# Altium footprint library THU VIEN V1.PcbLib: 400 footprints (part 6 of 25)
Each footprint in its own frame and in the unit in brackets; x right, y up, seen from the top. Pads: shape width x height; smd on the part's side, far side on the other; paste and mask are expansions set on the pad; w line width, h text height; cw(c..) or ccw(c..) is an arc to the next point about the centre after c.
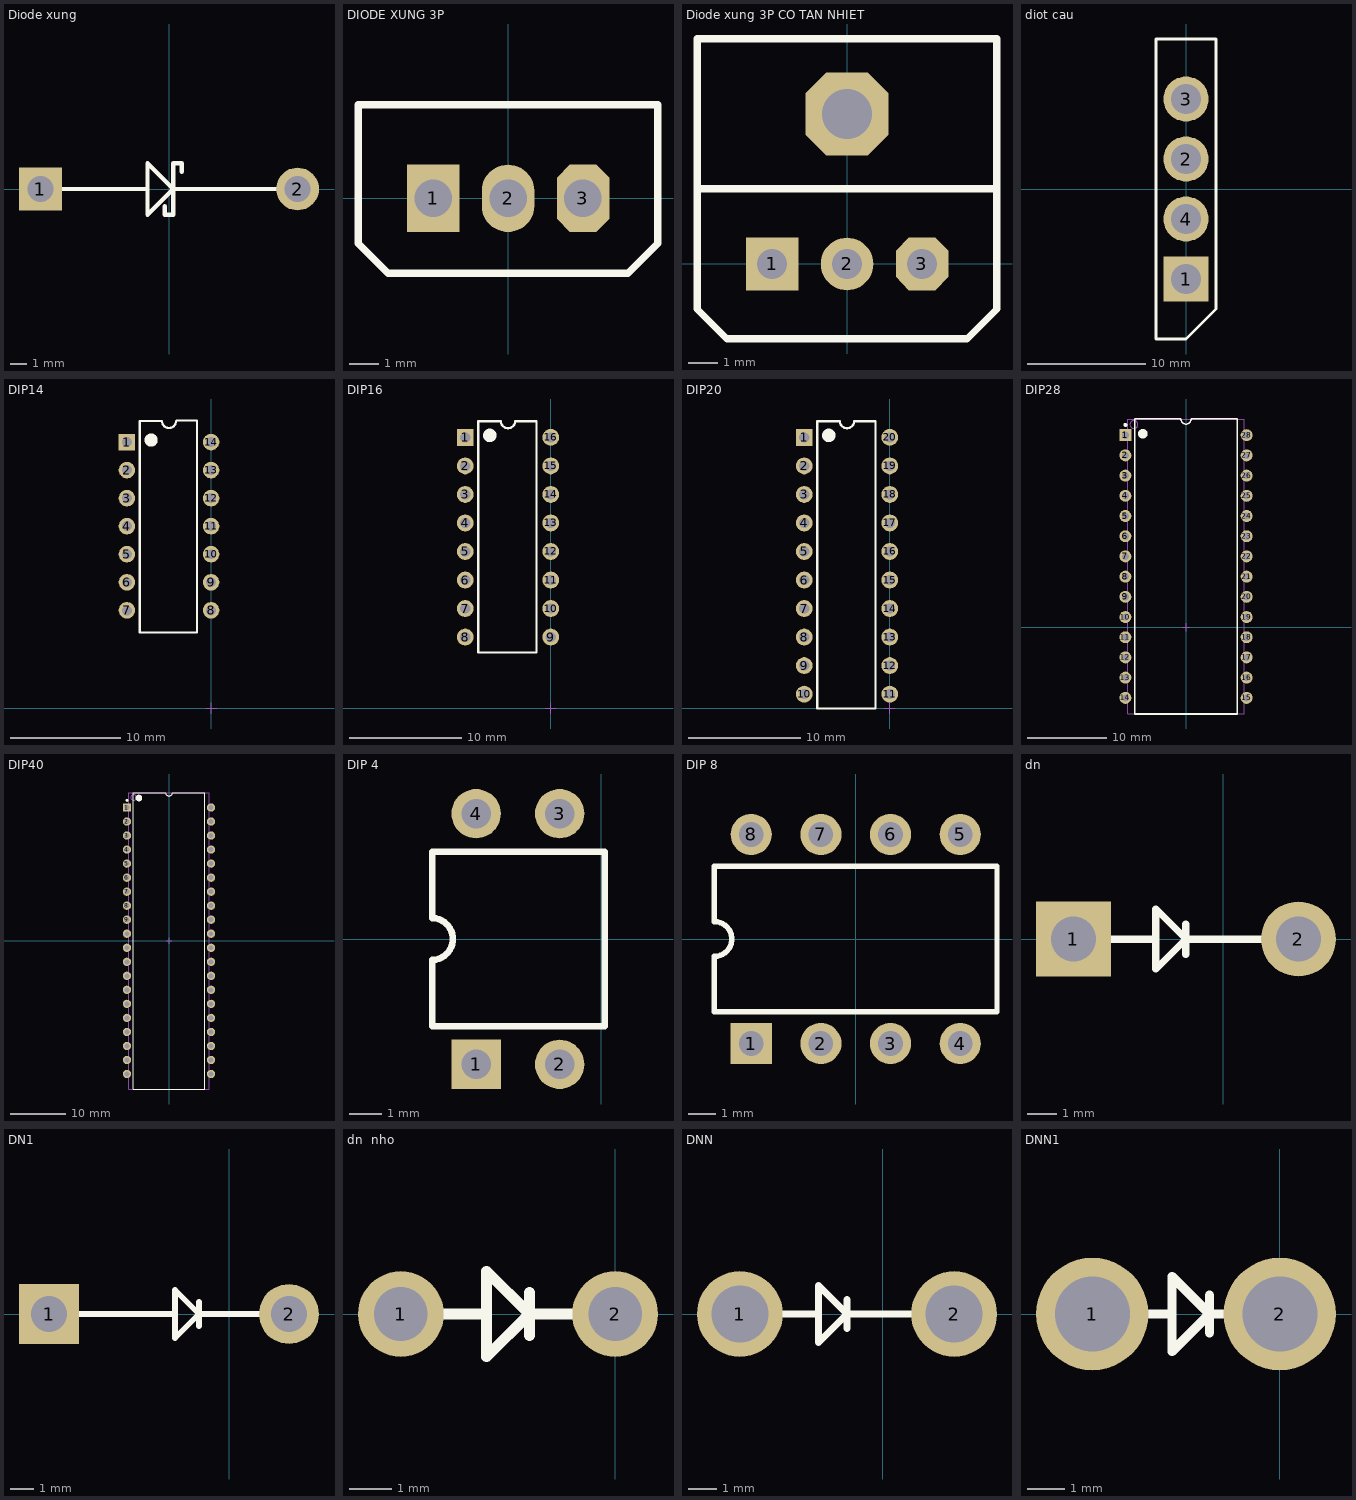
[diagram p5: the footprints below, top view; thin cyan lines are the x and y axes]

## Diode xung [mil]
pads (2):
  rect 100x100 hole 60: 1(-300,0)
  round 100 hole 60: 2(300,0)
Top Overlay:
  lines w10: -300,0 -50,0 ; -10,-40 -10,-60 10,-60 10,60 30,60 30,40 ; 300,0 10,0 ; 10,0 -50,60 -50,-60 10,0
3D body: height 188.58, standoff -96.85, extent -321.85,-88.59 321.85,88.58

## DIODE XUNG 3P [mil]
pads (3):
  rect 70x90 hole 50: 1(-100,0)
  oval 70x90 hole 50: 2(0,0)
  oct 70x90 hole 50: 3(100,0)
Top Overlay:
  lines w10: -200,-60 -200,125 200,125 200,-60 160,-100 -160,-100 -200,-60
3D body: height 854.72, standoff -300, extent -220.72,-58.85 220.73,125.8

## Diode xung 3P CO TAN NHIET [mil]
pads (4):
  rect 70x70 hole 40: 1(-100,0)
  round 70 hole 40: 2(0,0)
  oct 70x70 hole 40: 3(100,0)
  oct 110.24x110.24 hole 66.93: ""(0,200)
Top Overlay:
  lines w10: -200,100 200,100 ; -200,-60 -160,-100 160,-100 200,-60 200,300 -200,300 -200,-60
3D body: height 980, standoff -142.05, extent -245.03,44 251.03,299.94
3D body: height 854.72, standoff -300, extent -220.72,-58.85 220.73,125.8

## diot cau [mm]
pads (4):
  rect 3.81x3.81 hole 2.54: 1(0,-7.62)
  round 3.81 hole 2.54: 2(0,2.54) 3(0,7.62) 4(0,-2.54)
Top Overlay:
  lines w0.254: -2.54,-12.7 0,-12.7 2.54,-10.16 2.54,12.7 -2.54,12.7 -2.54,-12.7
3D body: height 22.61, standoff -14.02, extent -1.472,-11.15 2.288,11.15

## DIP14 [mm] "DIP, 40-Leads, Row Spacing 15.24mm, Pitch 2.54mm, Body 51.8x13.5mm"
height 6.35
pads (14):
  rect 1.5x1.5 hole 0.9: 1(-7.62,24.13)
  round 1.5 hole 0.9: 2(-7.62,21.59) 3(-7.62,19.05) 4(-7.62,16.51) 5(-7.62,13.97) 6(-7.62,11.43) 7(-7.62,8.89) 8(0,8.89) 9(0,11.43) 10(0,13.97) 11(0,16.51) 12(0,19.05) 13(0,21.59) 14(0,24.13)
Top Overlay:
  circle w0.6: c-5.431,24.308 r0.3
  lines w0.2: -3.175,26.035 cw(c-3.81,26.035) -4.445,26.035 -4.946,26.035 -6.45,26.035 -6.45,6.883 -1.27,6.883 -1.27,26.082 -1.372,26.082 -3.12,26.082 -3.124,26.086
Mechanical 15:
  lines w0.1: -0.5,0 0.5,0 ; 0,-0.5 0,0.5
3D body: height 5.1, standoff -3.3, extent -7.796,6.408 0.074,26.408

## DIP16 [mm] "DIP, 40-Leads, Row Spacing 15.24mm, Pitch 2.54mm, Body 51.8x13.5mm"
height 6.35
pads (16):
  rect 1.5x1.5 hole 0.9: 1(-7.62,24.13)
  round 1.5 hole 0.9: 2(-7.62,21.59) 3(-7.62,19.05) 4(-7.62,16.51) 5(-7.62,13.97) 6(-7.62,11.43) 7(-7.62,8.89) 8(-7.62,6.35) 9(0,6.35) 10(0,8.89) 11(0,11.43) 12(0,13.97) 13(0,16.51) 14(0,19.05) 15(0,21.59) 16(0,24.13)
Top Overlay:
  circle w0.6: c-5.431,24.308 r0.3
  lines w0.2: -6.45,4.978 -6.45,25.578 -4.445,25.578 ccw(c-3.81,25.578) -3.175,25.578 -1.27,25.578 -1.27,4.978 -6.45,4.978
Mechanical 15:
  lines w0.1: -0.5,0 0.5,0 ; 0,-0.5 0,0.5
3D body: height 5.1, standoff -3.3, extent -7.72,5.248 0.15,25.248

## DIP20 [mm] "DIP, 40-Leads, Row Spacing 15.24mm, Pitch 2.54mm, Body 51.8x13.5mm"
height 6.35
pads (20):
  rect 1.5x1.5 hole 0.9: 1(-7.62,24.13)
  round 1.5 hole 0.9: 2(-7.62,21.59) 3(-7.62,19.05) 4(-7.62,16.51) 5(-7.62,13.97) 6(-7.62,11.43) 7(-7.62,8.89) 8(-7.62,6.35) 9(-7.62,3.81) 10(-7.62,1.27) 11(0,1.27) 12(0,3.81) 13(0,6.35) 14(0,8.89) 15(0,11.43) 16(0,13.97) 17(0,16.51) 18(0,19.05) 19(0,21.59) 20(0,24.13)
Top Overlay:
  circle w0.6: c-5.431,24.308 r0.3
  lines w0.2: -6.45,0 -6.45,25.578 -4.445,25.578 ccw(c-3.81,25.578) -3.175,25.578 -1.27,25.578 -1.27,0 -6.45,0
Mechanical 15:
  lines w0.1: -0.5,0 0.5,0 ; 0,-0.5 0,0.5
3D body: height 4.57, standoff -3.81, extent -7.72,-0.505 0.1,26.035

## DIP28 [mm] "DIP, 40-Leads, Row Spacing 15.24mm, Pitch 2.54mm, Body 51.8x13.5mm"
height 6.35
pads (28):
  rect 1.5x1.5 hole 0.9: 1(-7.62,24.13)
  round 1.5 hole 0.9: 2(-7.62,21.59) 3(-7.62,19.05) 4(-7.62,16.51) 5(-7.62,13.97) 6(-7.62,11.43) 7(-7.62,8.89) 8(-7.62,6.35) 9(-7.62,3.81) 10(-7.62,1.27) 11(-7.62,-1.27) 12(-7.62,-3.81) 13(-7.62,-6.35) 14(-7.62,-8.89) 15(7.62,-8.89) 16(7.62,-6.35) 17(7.62,-3.81) 18(7.62,-1.27) 19(7.62,1.27) 20(7.62,3.81) 21(7.62,6.35) 22(7.62,8.89) 23(7.62,11.43) 24(7.62,13.97) 25(7.62,16.51) 26(7.62,19.05) 27(7.62,21.59) 28(7.62,24.13)
Top Overlay:
  circle w0.6: c-5.431,24.308 r0.3
  circle w0.25: c-7.62,25.43 r0.125
  lines w0.2: -0.635,26.162 ccw(c0,26.162) 0.635,26.162 ; -0.635,26.187 -6.45,26.187 -6.45,-10.922 6.45,-10.922 6.45,26.187 0.635,26.187
Mechanical 13:
  circle w0.1: c-6.545,25.476 r0.5
  lines w0.1: -7.3,-10.922 7.3,-10.922 7.3,26.137 -7.3,26.137 -7.3,-10.922
Mechanical 15:
  lines w0.1: -0.5,0 0.5,0 ; 0,-0.5 0,0.5
3D body: height 5.79, standoff -3.3, extent -7.618,-11.202 7.618,26.138

## DIP40 [mm] "DIP, 40-Leads, Row Spacing 15.24mm, Pitch 2.54mm, Body 51.8x13.5mm"
height 6.35
pads (40):
  rect 1.5x1.5 hole 0.9: 1(-7.62,24.13)
  round 1.5 hole 0.9: 2(-7.62,21.59) 3(-7.62,19.05) 4(-7.62,16.51) 5(-7.62,13.97) 6(-7.62,11.43) 7(-7.62,8.89) 8(-7.62,6.35) 9(-7.62,3.81) 10(-7.62,1.27) 11(-7.62,-1.27) 12(-7.62,-3.81) 13(-7.62,-6.35) 14(-7.62,-8.89) 15(-7.62,-11.43) 16(-7.62,-13.97) 17(-7.62,-16.51) 18(-7.62,-19.05) 19(-7.62,-21.59) 20(-7.62,-24.13) 21(7.62,-24.13) 22(7.62,-21.59) 23(7.62,-19.05) 24(7.62,-16.51) 25(7.62,-13.97) 26(7.62,-11.43) 27(7.62,-8.89) 28(7.62,-6.35) 29(7.62,-3.81) 30(7.62,-1.27) 31(7.62,1.27) 32(7.62,3.81) 33(7.62,6.35) 34(7.62,8.89) 35(7.62,11.43) 36(7.62,13.97) 37(7.62,16.51) 38(7.62,19.05) 39(7.62,21.59) 40(7.62,24.13)
Top Overlay:
  circle w0.25: c-7.62,25.43 r0.125
  circle w0.6: c-5.45,25.85 r0.3
  lines w0.2: -6.45,-26.85 -6.45,26.85 -0.635,26.85 ccw(c0,26.85) 0.635,26.85 6.45,26.85 6.45,-26.85 -6.45,-26.85
Mechanical 13:
  circle w0.1: c-6.4,25.95 r0.5
  lines w0.1: -7.3,-26.85 -7.3,26.85 7.3,26.85 7.3,-26.85 -7.3,-26.85
Mechanical 15:
  lines w0.1: -0.5,0 0.5,0 ; 0,-0.5 0,0.5
3D body: height 5.79, standoff -3.3, extent -7.564,-26.427 7.722,26.173

## DIP 4 [mm] "DIP; 8 Leads; Row Spacing 7.62 mm; Pitch 2.54 mm"
height 5.08
pads (4):
  rect 1.5x1.5 hole 0.9: 1(-3.81,-3.81)
  round 1.5 hole 0.9: 2(-1.27,-3.81) 3(-1.27,3.81) 4(-3.81,3.81)
Top Overlay:
  lines w0.2: -5.15,-2.65 -5.15,-0.635 ccw(c-5.15,0) -5.15,0.635 -5.15,2.65 0.102,2.65 0.102,-2.65 -5.15,-2.65
3D body: height 4.31, standoff -3.28, extent -5.258,-3.949 0.282,4.051

## DIP 8 [mm] "DIP; 8 Leads; Row Spacing 7.62 mm; Pitch 2.54 mm"
height 5.08
pads (8):
  rect 1.5x1.5 hole 0.9: 1(-3.81,-3.81)
  round 1.5 hole 0.9: 2(-1.27,-3.81) 3(1.27,-3.81) 4(3.81,-3.81) 5(3.81,3.81) 6(1.27,3.81) 7(-1.27,3.81) 8(-3.81,3.81)
Top Overlay:
  lines w0.2: -5.15,-2.65 -5.15,-0.635 ccw(c-5.15,0) -5.15,0.635 -5.15,2.65 5.15,2.65 5.15,-2.65 -5.15,-2.65
3D body: height 5.08, standoff -3.5, extent -5.638,-3.96 5.282,3.91

## dn [mil]
pads (2):
  rect 100x100 hole 60: 1(-200,0)
  round 100 hole 60: 2(100,0)
Top Overlay:
  lines w10: -200,0 -90,0 ; -50,-20 -50,20 ; 100,0 -50,0 ; -50,0 -90,40 -90,30 -90,-40 -50,0
3D body: height 120.61, standoff -50, extent -215.5,-52.5 115.5,52.5

## DN1 [mil]
pads (2):
  rect 100x100 hole 60: 1(-300,0)
  round 100 hole 60: 2(100,0)
Top Overlay:
  lines w10: -300,0 -90,0 ; -50,-20 -50,20 ; 100,0 -50,0 ; -50,0 -90,-40 -90,30 -90,40 -50,0
3D body: height 120.61, standoff -50, extent -265.5,-52.5 65.5,52.5

## dn  nho [mil]
pads (2):
  round 80 hole 50: 1(-200,0) 2(0,0)
Top Overlay:
  lines w10: -200,0 -120,0 ; -80,-20 -80,20 ; 0,0 -80,0 ; -80,0 -120,40 -120,30 -120,-40 -80,0
3D body: height 120.61, standoff -50, extent -270,-52.5 61,52.5

## DNN [mil]
pads (2):
  round 120 hole 80: 1(-200,0) 2(100,0)
Top Overlay:
  lines w10: -200,0 -90,0 ; -50,-20 -50,20 ; 100,0 -50,0 ; -50,0 -90,40 -90,30 -90,-40 -50,0
3D body: height 120.61, standoff -50, extent -215.5,-52.5 115.5,52.5

## DNN1 [mil]
pads (2):
  round 120 hole 80: 1(-200,0) 2(0,0)
Top Overlay:
  lines w10: -200,0 -115,0 ; -75,-20 -75,20 ; 0,0 -75,0 ; -75,0 -115,40 -115,30 -115,-40 -75,0